# Altium footprint library LongMen.PcbLib: 245 footprints (part 6 of 16)
Each footprint in its own frame and in the unit in brackets; x right, y up, seen from the top. Pads: shape width x height; smd on the part's side, far side on the other; paste and mask are expansions set on the pad; w line width, h text height; cw(c..) or ccw(c..) is an arc to the next point about the centre after c.
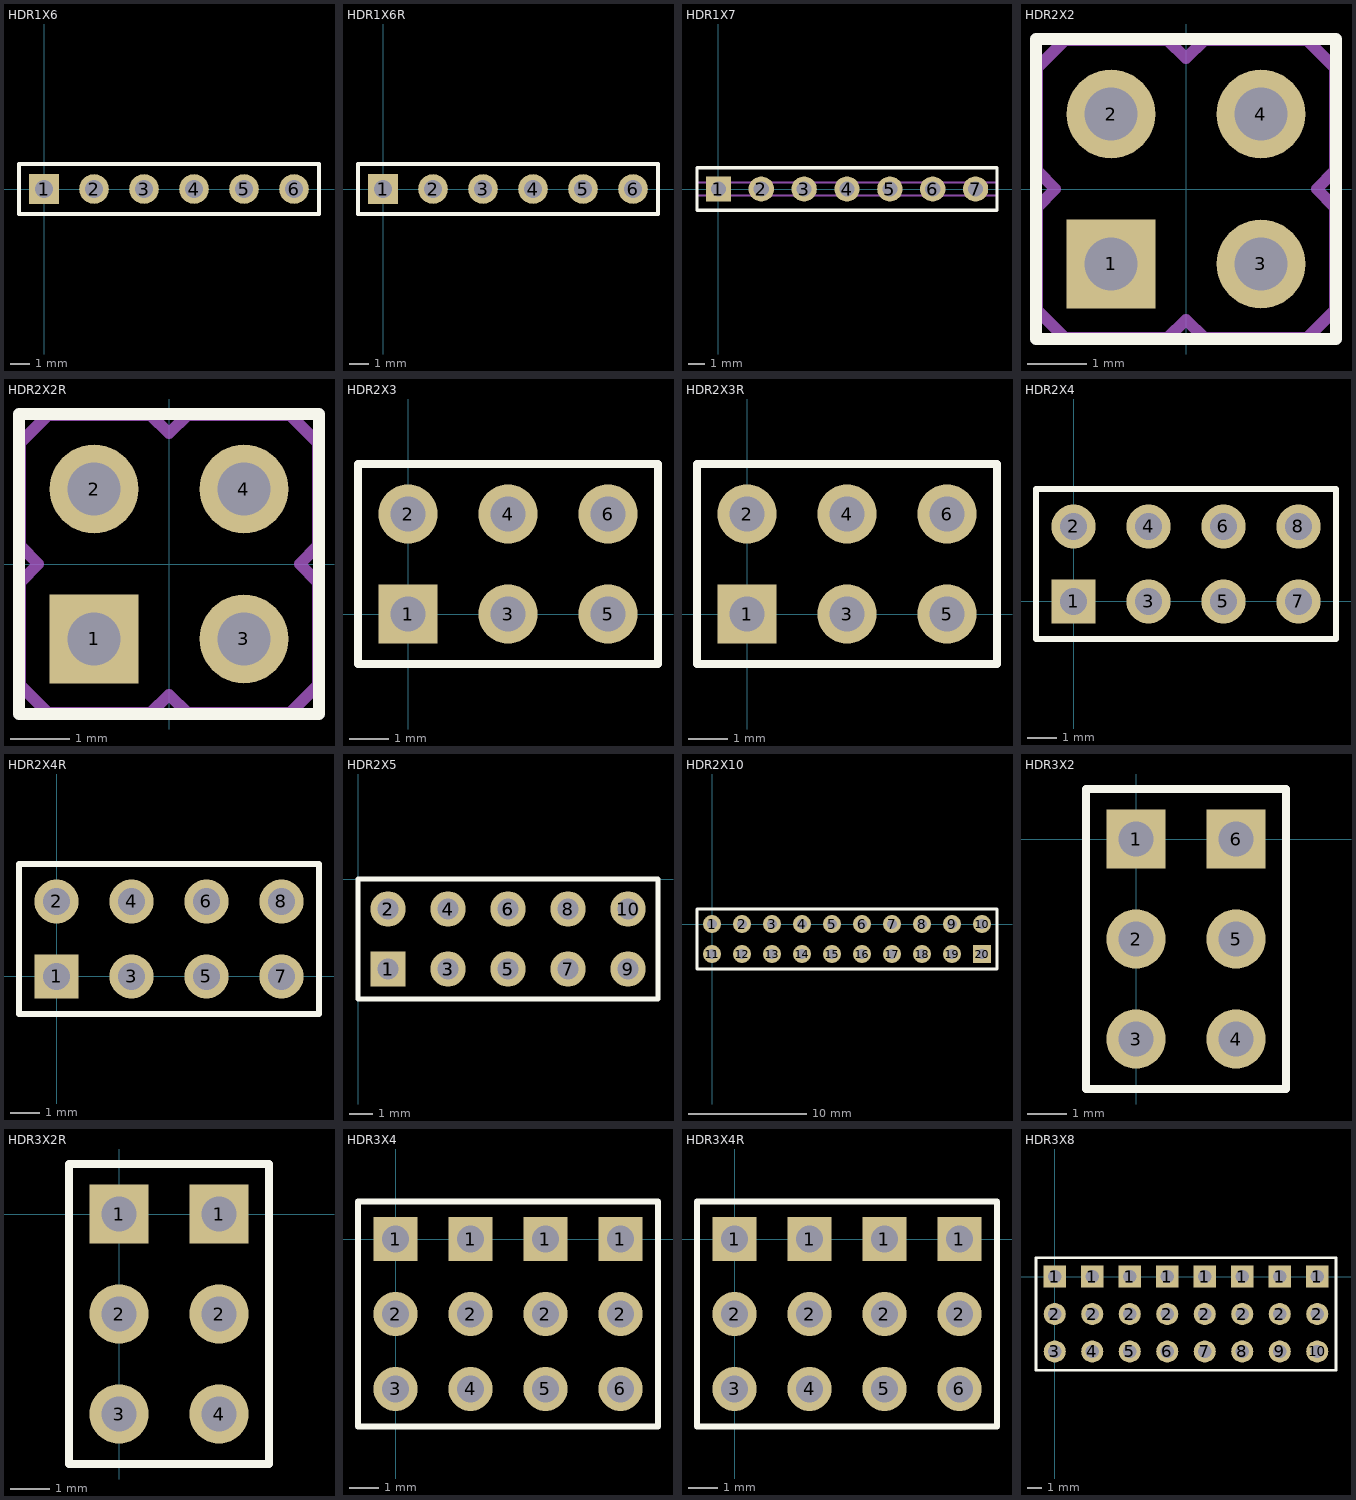
[diagram p5: the footprints below, top view; thin cyan lines are the x and y axes]

## HDR1X6 [mm] "Connector; Header; 6 Position"
pads (6):
  rect 1.5x1.5 hole 0.9: 1(0,0)
  round 1.5 hole 0.9: 2(2.54,0) 3(5.08,0) 4(7.62,0) 5(10.16,0) 6(12.7,0)
Top Overlay:
  lines w0.2: -1.27,-1.27 -1.27,1.27 13.97,1.27 13.97,-1.27 -1.27,-1.27
Mechanical 16:
  lines w0.1: -0.3,-0.3 0.3,-0.3 0.3,0.3 -0.3,0.3 -0.3,-0.3 ; 2.24,-0.3 2.84,-0.3 2.84,0.3 2.24,0.3 2.24,-0.3 ; 4.78,-0.3 5.38,-0.3 5.38,0.3 4.78,0.3 4.78,-0.3 ; 7.32,-0.3 7.92,-0.3 7.92,0.3 7.32,0.3 7.32,-0.3 ; 9.86,-0.3 10.46,-0.3 10.46,0.3 9.86,0.3 9.86,-0.3 ; 12.4,-0.3 13,-0.3 13,0.3 12.4,0.3 12.4,-0.3
3D body: height 8.54, standoff -3, extent -1.27,-1.245 13.97,1.245

## HDR1X6R [mm] "Connector; Header; 6 Position"
pads (6):
  rect 1.5x1.5 hole 0.9: 1(0,0)
  round 1.5 hole 0.9: 2(2.54,0) 3(5.08,0) 4(7.62,0) 5(10.16,0) 6(12.7,0)
Top Overlay:
  lines w0.2: -1.27,-1.27 13.97,-1.27 13.97,1.27 -1.27,1.27 -1.27,-1.27
Mechanical 16:
  lines w0.1: -0.3,-0.3 -0.3,0.3 0.3,0.3 0.3,-0.3 -0.3,-0.3 ; 2.24,-0.3 2.24,0.3 2.84,0.3 2.84,-0.3 2.24,-0.3 ; 4.78,-0.3 4.78,0.3 5.38,0.3 5.38,-0.3 4.78,-0.3 ; 7.32,-0.3 7.32,0.3 7.92,0.3 7.92,-0.3 7.32,-0.3 ; 9.86,-0.3 9.86,0.3 10.46,0.3 10.46,-0.3 9.86,-0.3 ; 12.4,-0.3 12.4,0.3 13,0.3 13,-0.3 12.4,-0.3
3D body: height 2.51, standoff -3, extent -1.27,-0.32 13.97,9.81

## HDR1X7 [mm] "Connector; Header; 7 Position"
pads (7):
  rect 1.5x1.5 hole 0.9: 1(0,0)
  round 1.5 hole 0.9: 2(2.54,0) 3(5.08,0) 4(7.62,0) 5(10.16,0) 6(12.7,0) 7(15.24,0)
Top Overlay:
  lines w0.2: -1.27,-1.27 16.51,-1.27 16.51,1.27 -1.27,1.27 -1.27,-1.27
Mechanical 15:
  lines w0.1: -1.27,-0.381 -1.27,-1.27 16.51,-1.27 16.51,-0.381 ; -1.27,-0.381 16.51,-0.381 ; -1.27,-0.381 -0.381,-0.381 -0.381,0.381 -1.27,0.381 ; -1.27,-0.381 -1.27,0.381 ; -1.27,0.381 16.51,0.381 ; -1.27,0.381 -1.27,1.27 16.51,1.27 16.51,0.381 ; 16.51,-0.381 15.621,-0.381 15.621,0.381 16.51,0.381 ; 16.51,-0.381 16.51,0.381 ; 0.381,-0.381 0.381,0.381 2.159,0.381 2.159,-0.381 0.381,-0.381 ; 2.921,-0.381 2.921,0.381 4.699,0.381 4.699,-0.381 2.921,-0.381 ; 5.461,-0.381 5.461,0.381 7.239,0.381 7.239,-0.381 5.461,-0.381 ; 8.001,-0.381 8.001,0.381 9.779,0.381 9.779,-0.381 8.001,-0.381 ; 10.541,-0.381 10.541,0.381 12.319,0.381 12.319,-0.381 10.541,-0.381 ; 13.081,-0.381 13.081,0.381 14.859,0.381 14.859,-0.381 13.081,-0.381
Mechanical 16:
  lines w0.1: -1.27,-1.27 16.51,-1.27 16.51,1.27 -1.27,1.27 -1.27,-1.27 ; -0.3,-0.3 -0.3,0.3 0.3,0.3 0.3,-0.3 -0.3,-0.3 ; 2.24,-0.3 2.24,0.3 2.84,0.3 2.84,-0.3 2.24,-0.3 ; 4.78,-0.3 4.78,0.3 5.38,0.3 5.38,-0.3 4.78,-0.3 ; 7.32,-0.3 7.32,0.3 7.92,0.3 7.92,-0.3 7.32,-0.3 ; 9.86,-0.3 9.86,0.3 10.46,0.3 10.46,-0.3 9.86,-0.3 ; 12.4,-0.3 12.4,0.3 13,0.3 13,-0.3 12.4,-0.3 ; 14.94,-0.3 14.94,0.3 15.54,0.3 15.54,-0.3 14.94,-0.3
3D body: height 0, standoff -2, extent 14.941,-0.299 15.539,0.299
3D body: height 0, standoff -2, extent 12.401,-0.299 12.999,0.299
3D body: height 0, standoff -2, extent 9.861,-0.299 10.459,0.299
3D body: height 0, standoff -2, extent 7.321,-0.299 7.919,0.299
3D body: height 0, standoff -2, extent 4.781,-0.299 5.379,0.299
3D body: height 0, standoff -2, extent 2.241,-0.299 2.839,0.299
3D body: height 0, standoff -2, extent -0.299,-0.299 0.299,0.299
3D body: height 8, standoff 0, extent -1.269,-1.269 16.509,-0.382
3D body: height 8, standoff 0, extent -1.269,0.382 16.509,1.269
3D body: height 8, standoff 0, extent 5.462,-0.38 7.238,0.38
3D body: height 8, standoff 0, extent 8.002,-0.38 9.778,0.38
3D body: height 8, standoff 0, extent 10.542,-0.38 12.318,0.38
3D body: height 8, standoff 0, extent 13.082,-0.38 14.858,0.38
3D body: height 8, standoff 0, extent 2.922,-0.38 4.698,0.38
3D body: height 8, standoff 0, extent 0.382,-0.38 2.158,0.38
3D body: height 8, standoff 0, extent -1.269,-0.38 -0.382,0.38
3D body: height 8, standoff 0, extent 15.622,-0.38 16.509,0.38

## HDR2X2 [mm]
pads (4):
  rect 1.5x1.5 hole 0.9: 1(-1.27,-1.27)
  round 1.5 hole 0.9: 2(-1.27,1.27) 3(1.27,-1.27) 4(1.27,1.27)
Top Overlay:
  lines w0.2: -2.54,-2.54 -2.54,2.54 2.54,2.54 2.54,-2.54 -2.54,-2.54
Mechanical 15:
  lines w0.2: -2.52,-2.052 -2.52,-0.615 -2.52,-0.308 -2.213,0 -2.52,0.308 -2.52,0.615 -2.52,2.052 -2.052,2.52 -0.615,2.52 -0.308,2.52 0,2.213 0.308,2.52 0.615,2.52 2.052,2.52 2.52,2.052 2.52,0.615 2.52,0.308 2.213,0 2.52,-0.308 2.52,-0.615 2.52,-2.052 2.052,-2.52 0.615,-2.52 0.308,-2.52 0,-2.213 -0.308,-2.52 -0.615,-2.52 -2.052,-2.52 -2.52,-2.052
Mechanical 16:
  lines w0.2: -1.57,-1.57 -0.97,-1.57 -0.97,-0.97 -1.57,-0.97 -1.57,-1.57 ; -1.57,0.97 -0.97,0.97 -0.97,1.57 -1.57,1.57 -1.57,0.97 ; 0.97,-1.57 1.57,-1.57 1.57,-0.97 0.97,-0.97 0.97,-1.57 ; 0.97,0.97 1.57,0.97 1.57,1.57 0.97,1.57 0.97,0.97
3D body: height 8.54, standoff -3, extent -2.54,-2.515 2.54,2.515

## HDR2X2R [mm]
pads (4):
  rect 1.5x1.5 hole 0.9: 1(-1.27,-1.27)
  round 1.5 hole 0.9: 2(-1.27,1.27) 3(1.27,-1.27) 4(1.27,1.27)
Top Overlay:
  lines w0.2: -2.54,-2.54 -2.54,2.54 2.54,2.54 2.54,-2.54 -2.54,-2.54
Mechanical 15:
  lines w0.2: -2.52,-2.052 -2.52,-0.615 -2.52,-0.308 -2.213,0 -2.52,0.308 -2.52,0.615 -2.52,2.052 -2.052,2.52 -0.615,2.52 -0.308,2.52 0,2.213 0.308,2.52 0.615,2.52 2.052,2.52 2.52,2.052 2.52,0.615 2.52,0.308 2.213,0 2.52,-0.308 2.52,-0.615 2.52,-2.052 2.052,-2.52 0.615,-2.52 0.308,-2.52 0,-2.213 -0.308,-2.52 -0.615,-2.52 -2.052,-2.52 -2.52,-2.052
Mechanical 16:
  lines w0.2: -1.57,-1.57 -0.97,-1.57 -0.97,-0.97 -1.57,-0.97 -1.57,-1.57 ; -1.57,0.97 -0.97,0.97 -0.97,1.57 -1.57,1.57 -1.57,0.97 ; 0.97,-1.57 1.57,-1.57 1.57,-0.97 0.97,-0.97 0.97,-1.57 ; 0.97,0.97 1.57,0.97 1.57,1.57 0.97,1.57 0.97,0.97
3D body: height 5.05, standoff -3, extent -2.54,-1.59 2.54,11.08

## HDR2X3 [mm] "Connector; Header; 3x2 Position"
pads (6):
  rect 1.5x1.5 hole 0.9: 1(0,0)
  round 1.5 hole 0.9: 2(0,2.54) 3(2.54,0) 4(2.54,2.54) 5(5.08,0) 6(5.08,2.54)
Top Overlay:
  lines w0.2: 1.482,-1.27 6.35,-1.27 ; 6.35,-1.27 -1.27,-1.27 -1.27,3.81 6.35,3.81 6.35,-1.27
Mechanical 16:
  lines w0.1: -0.3,-0.3 -0.3,0.3 0.3,0.3 0.3,-0.3 -0.3,-0.3 ; -0.3,2.24 -0.3,2.84 0.3,2.84 0.3,2.24 -0.3,2.24 ; 2.24,-0.3 2.24,0.3 2.84,0.3 2.84,-0.3 2.24,-0.3 ; 2.24,2.24 2.24,2.84 2.84,2.84 2.84,2.24 2.24,2.24 ; 4.78,-0.3 4.78,0.3 5.38,0.3 5.38,-0.3 4.78,-0.3 ; 4.78,2.24 4.78,2.84 5.38,2.84 5.38,2.24 4.78,2.24
3D body: height 8.54, standoff -3, extent -1.27,-1.245 6.35,3.785

## HDR2X3R [mm] "Connector; Header; 3x2 Position"
pads (6):
  rect 1.5x1.5 hole 0.9: 1(0,0)
  round 1.5 hole 0.9: 2(0,2.54) 3(2.54,0) 4(2.54,2.54) 5(5.08,0) 6(5.08,2.54)
Top Overlay:
  lines w0.2: 1.482,-1.27 6.35,-1.27 ; 6.35,-1.27 -1.27,-1.27 -1.27,3.81 6.35,3.81 6.35,-1.27
Mechanical 16:
  lines w0.1: -0.3,-0.3 -0.3,0.3 0.3,0.3 0.3,-0.3 -0.3,-0.3 ; -0.3,2.24 -0.3,2.84 0.3,2.84 0.3,2.24 -0.3,2.24 ; 2.24,-0.3 2.24,0.3 2.84,0.3 2.84,-0.3 2.24,-0.3 ; 2.24,2.24 2.24,2.84 2.84,2.84 2.84,2.24 2.24,2.24 ; 4.78,-0.3 4.78,0.3 5.38,0.3 5.38,-0.3 4.78,-0.3 ; 4.78,2.24 4.78,2.84 5.38,2.84 5.38,2.24 4.78,2.24
3D body: height 5.05, standoff -3, extent -1.27,-0.32 6.35,12.35

## HDR2X4 [mm] "Connector; Header; 3x2 Position"
pads (8):
  rect 1.5x1.5 hole 0.9: 1(0,0)
  round 1.5 hole 0.9: 2(0,2.54) 3(2.54,0) 4(2.54,2.54) 5(5.08,0) 6(5.08,2.54) 7(7.62,0) 8(7.62,2.54)
Top Overlay:
  lines w0.2: 1.482,-1.27 8.89,-1.27 8.89,3.81 -1.27,3.81 -1.27,-1.27 6.35,-1.27
Mechanical 16:
  lines w0.1: -0.3,-0.3 -0.3,0.3 0.3,0.3 0.3,-0.3 -0.3,-0.3 ; -0.3,2.24 -0.3,2.84 0.3,2.84 0.3,2.24 -0.3,2.24 ; 2.24,-0.3 2.24,0.3 2.84,0.3 2.84,-0.3 2.24,-0.3 ; 2.24,2.24 2.24,2.84 2.84,2.84 2.84,2.24 2.24,2.24 ; 4.78,-0.3 4.78,0.3 5.38,0.3 5.38,-0.3 4.78,-0.3 ; 4.78,2.24 4.78,2.84 5.38,2.84 5.38,2.24 4.78,2.24
3D body: height 8.54, standoff -3, extent -1.27,-1.245 8.89,3.785

## HDR2X4R [mm] "Connector; Header; 3x2 Position"
pads (8):
  rect 1.5x1.5 hole 0.9: 1(0,0)
  round 1.5 hole 0.9: 2(0,2.54) 3(2.54,0) 4(2.54,2.54) 5(5.08,0) 6(5.08,2.54) 7(7.62,0) 8(7.62,2.54)
Top Overlay:
  lines w0.2: 1.482,-1.27 8.89,-1.27 8.89,3.81 -1.27,3.81 -1.27,-1.27 6.35,-1.27
Mechanical 16:
  lines w0.1: -0.3,-0.3 -0.3,0.3 0.3,0.3 0.3,-0.3 -0.3,-0.3 ; -0.3,2.24 -0.3,2.84 0.3,2.84 0.3,2.24 -0.3,2.24 ; 2.24,-0.3 2.24,0.3 2.84,0.3 2.84,-0.3 2.24,-0.3 ; 2.24,2.24 2.24,2.84 2.84,2.84 2.84,2.24 2.24,2.24 ; 4.78,-0.3 4.78,0.3 5.38,0.3 5.38,-0.3 4.78,-0.3 ; 4.78,2.24 4.78,2.84 5.38,2.84 5.38,2.24 4.78,2.24
3D body: height 5.05, standoff -3, extent -1.27,-0.32 8.89,12.35

## HDR2X5 [mm]
pads (16):
  rect 1.5x1.5 hole 0.9: 1(1.27,-3.81) 1(1.27,-3.81)
  round 1.5 hole 0.9: 2(1.27,-1.27) 2(1.27,-1.27) 3(3.81,-3.81) 3(3.81,-3.81) 4(3.81,-1.27) 4(3.81,-1.27) 5(6.35,-3.81) 5(6.35,-3.81) 6(6.35,-1.27) 6(6.35,-1.27) 7(8.89,-3.81) 8(8.89,-1.27) 9(11.43,-3.81) 10(11.43,-1.27)
Top Overlay:
  lines w0.2: 0,-5.08 0,0 ; 0,-5.08 12.7,-5.08 ; 0,-5.08 0,0 ; 0,-5.08 12.7,-5.08 ; 0,0 12.7,0 ; 0,0 12.7,0 ; 12.7,-5.08 12.7,0 ; 12.7,-5.08 2.752,-5.08 12.7,-5.08
Mechanical 16:
  lines w0.1: 0.97,-4.11 1.57,-4.11 ; 0.97,-4.11 0.97,-3.51 ; 0.97,-4.11 1.57,-4.11 ; 0.97,-4.11 0.97,-3.51 ; 0.97,-3.51 1.57,-3.51 ; 0.97,-3.51 1.57,-3.51 ; 0.97,-1.57 1.57,-1.57 ; 0.97,-1.57 0.97,-0.97 ; 0.97,-1.57 1.57,-1.57 ; 0.97,-1.57 0.97,-0.97 ; 0.97,-0.97 1.57,-0.97 ; 0.97,-0.97 1.57,-0.97 ; 1.57,-4.11 1.57,-3.51 ; 1.57,-4.11 1.57,-3.51 ; 1.57,-1.57 1.57,-0.97 ; 1.57,-1.57 1.57,-0.97 ; 3.51,-4.11 4.11,-4.11 ; 3.51,-4.11 3.51,-3.51 ; 3.51,-4.11 4.11,-4.11 ; 3.51,-4.11 3.51,-3.51 ; 3.51,-3.51 4.11,-3.51 ; 3.51,-3.51 4.11,-3.51 ; 3.51,-1.57 4.11,-1.57 ; 3.51,-1.57 3.51,-0.97 ; 3.51,-1.57 4.11,-1.57 ; 3.51,-1.57 3.51,-0.97 ; 3.51,-0.97 4.11,-0.97 ; 3.51,-0.97 4.11,-0.97 ; 4.11,-4.11 4.11,-3.51 ; 4.11,-4.11 4.11,-3.51 ; 4.11,-1.57 4.11,-0.97 ; 4.11,-1.57 4.11,-0.97 ; 6.05,-4.11 6.65,-4.11 ; 6.05,-4.11 6.05,-3.51 ; 6.05,-4.11 6.65,-4.11 ; 6.05,-4.11 6.05,-3.51 ; 6.05,-3.51 6.65,-3.51 ; 6.05,-3.51 6.65,-3.51 ; 6.05,-1.57 6.65,-1.57 ; 6.05,-1.57 6.05,-0.97 ; 6.05,-1.57 6.65,-1.57 ; 6.05,-1.57 6.05,-0.97 ; 6.05,-0.97 6.65,-0.97 ; 6.05,-0.97 6.65,-0.97 ; 6.65,-4.11 6.65,-3.51 ; 6.65,-4.11 6.65,-3.51 ; 6.65,-1.57 6.65,-0.97 ; 6.65,-1.57 6.65,-0.97
3D body: height 8.54, standoff -3, extent 7.62,-5.055 12.7,-0.025
3D body: height 8.54, standoff -3, extent 0,-5.055 7.62,-0.025

## HDR2X10 [mil]
pads (20):
  round 60 hole 32: 1(0,0) 2(100,0) 3(200,0) 4(300,0) 5(400,0) 6(500,0) 7(600,0) 8(700,0) 9(800,0) 10(900,0) 11(0,-100) 12(100,-100) 13(200,-100) 14(300,-100) 15(400,-100) 16(500,-100) 17(600,-100) 18(700,-100) 19(800,-100)
  rect 60x60 hole 32: 20(900,-100)
Top Overlay:
  lines w10: -50,-150 -50,50 950,50 950,-150 -50,-150

## HDR3X2 [mm]
pads (6):
  rect 1.5x1.5 hole 0.9: 1(0,0) 6(2.54,0)
  round 1.5 hole 0.9: 2(0,-2.54) 3(0,-5.08) 4(2.54,-5.08) 5(2.54,-2.54)
Top Overlay:
  lines w0.2: -1.27,-6.35 3.81,-6.35 3.81,1.27 -1.27,1.27 -1.27,-6.35
Mechanical 16:
  lines w0.1: -0.3,-5.38 -0.3,-4.78 0.3,-4.78 0.3,-5.38 -0.3,-5.38 ; -0.3,-2.84 -0.3,-2.24 0.3,-2.24 0.3,-2.84 -0.3,-2.84 ; -0.3,-0.3 0.3,-0.3 0.3,0.3 -0.3,0.3 -0.3,-0.3 ; 2.24,-5.38 2.24,-4.78 2.84,-4.78 2.84,-5.38 2.24,-5.38 ; 2.24,-2.84 2.24,-2.24 2.84,-2.24 2.84,-2.84 2.24,-2.84 ; 2.24,-0.3 2.24,0.3 2.84,0.3 2.84,-0.3 2.24,-0.3
3D body: height 8.54, standoff -3, extent -1.27,-6.325 3.81,1.245

## HDR3X2R [mm]
pads (6):
  rect 1.5x1.5 hole 0.9: 1(0,0) 1(2.54,0)
  round 1.5 hole 0.9: 2(0,-2.54) 2(2.54,-2.54) 3(0,-5.08) 4(2.54,-5.08)
Top Overlay:
  lines w0.2: -1.27,-6.35 -1.27,1.27 3.81,1.27 3.81,-6.35 -1.27,-6.35
Mechanical 16:
  lines w0.1: -0.3,-5.38 0.3,-5.38 0.3,-4.78 -0.3,-4.78 -0.3,-5.38 ; -0.3,-2.84 0.3,-2.84 0.3,-2.24 -0.3,-2.24 -0.3,-2.84 ; -0.3,-0.3 -0.3,0.3 0.3,0.3 0.3,-0.3 -0.3,-0.3 ; 2.24,-5.38 2.84,-5.38 2.84,-4.78 2.24,-4.78 2.24,-5.38 ; 2.24,-2.84 2.84,-2.84 2.84,-2.24 2.24,-2.24 2.24,-2.84 ; 2.24,-0.3 2.84,-0.3 2.84,0.3 2.24,0.3 2.24,-0.3
3D body: height 7.59, standoff -3, extent -1.27,-5.4 3.81,9.81

## HDR3X4 [mm]
pads (12):
  rect 1.5x1.5 hole 0.9: 1(0,0) 1(2.54,0) 1(5.08,0) 1(7.62,0)
  round 1.5 hole 0.9: 2(0,-2.54) 2(2.54,-2.54) 2(5.08,-2.54) 2(7.62,-2.54) 3(0,-5.08) 4(2.54,-5.08) 5(5.08,-5.08) 6(7.62,-5.08)
Top Overlay:
  lines w0.2: -1.27,-6.35 8.89,-6.35 8.89,1.27 -1.27,1.27 -1.27,-6.35
Mechanical 16:
  lines w0.1: -0.3,-5.38 -0.3,-4.78 0.3,-4.78 0.3,-5.38 -0.3,-5.38 ; -0.3,-2.84 -0.3,-2.24 0.3,-2.24 0.3,-2.84 -0.3,-2.84 ; -0.3,-0.3 0.3,-0.3 0.3,0.3 -0.3,0.3 -0.3,-0.3 ; 2.24,-5.38 2.24,-4.78 2.84,-4.78 2.84,-5.38 2.24,-5.38 ; 2.24,-2.84 2.24,-2.24 2.84,-2.24 2.84,-2.84 2.24,-2.84 ; 2.24,-0.3 2.24,0.3 2.84,0.3 2.84,-0.3 2.24,-0.3 ; 4.78,-5.38 5.38,-5.38 5.38,-4.78 4.78,-4.78 4.78,-5.38 ; 4.78,-2.84 5.38,-2.84 5.38,-2.24 4.78,-2.24 4.78,-2.84 ; 4.78,-0.3 4.78,0.3 5.38,0.3 5.38,-0.3 4.78,-0.3 ; 7.32,-5.38 7.92,-5.38 7.92,-4.78 7.32,-4.78 7.32,-5.38 ; 7.32,-2.84 7.92,-2.84 7.92,-2.24 7.32,-2.24 7.32,-2.84 ; 7.32,-0.3 7.32,0.3 7.92,0.3 7.92,-0.3 7.32,-0.3
3D body: height 8.54, standoff -3, extent -1.27,-6.325 8.89,1.245

## HDR3X4R [mm]
pads (12):
  rect 1.5x1.5 hole 0.9: 1(0,0) 1(2.54,0) 1(5.08,0) 1(7.62,0)
  round 1.5 hole 0.9: 2(0,-2.54) 2(2.54,-2.54) 2(5.08,-2.54) 2(7.62,-2.54) 3(0,-5.08) 4(2.54,-5.08) 5(5.08,-5.08) 6(7.62,-5.08)
Top Overlay:
  lines w0.2: -1.27,-6.35 -1.27,1.27 8.89,1.27 8.89,-6.35 -1.27,-6.35
Mechanical 16:
  lines w0.1: -0.3,-5.38 0.3,-5.38 0.3,-4.78 -0.3,-4.78 -0.3,-5.38 ; -0.3,-2.84 0.3,-2.84 0.3,-2.24 -0.3,-2.24 -0.3,-2.84 ; -0.3,-0.3 -0.3,0.3 0.3,0.3 0.3,-0.3 -0.3,-0.3 ; 2.24,-5.38 2.84,-5.38 2.84,-4.78 2.24,-4.78 2.24,-5.38 ; 2.24,-2.84 2.84,-2.84 2.84,-2.24 2.24,-2.24 2.24,-2.84 ; 2.24,-0.3 2.84,-0.3 2.84,0.3 2.24,0.3 2.24,-0.3 ; 4.78,-5.38 4.78,-4.78 5.38,-4.78 5.38,-5.38 4.78,-5.38 ; 4.78,-2.84 4.78,-2.24 5.38,-2.24 5.38,-2.84 4.78,-2.84 ; 4.78,-0.3 5.38,-0.3 5.38,0.3 4.78,0.3 4.78,-0.3 ; 7.32,-5.38 7.32,-4.78 7.92,-4.78 7.92,-5.38 7.32,-5.38 ; 7.32,-2.84 7.32,-2.24 7.92,-2.24 7.92,-2.84 7.32,-2.84 ; 7.32,-0.3 7.92,-0.3 7.92,0.3 7.32,0.3 7.32,-0.3
3D body: height 7.59, standoff -3, extent -1.27,-5.4 8.89,9.81

## HDR3X8 [mm]
pads (24):
  rect 1.5x1.5 hole 0.9: 1(0,0) 1(2.54,0) 1(5.08,0) 1(7.62,0) 1(10.16,0) 1(12.7,0) 1(15.24,0) 1(17.78,0)
  round 1.5 hole 0.9: 2(0,-2.54) 2(2.54,-2.54) 2(5.08,-2.54) 2(7.62,-2.54) 2(10.16,-2.54) 2(12.7,-2.54) 2(15.24,-2.54) 2(17.78,-2.54) 3(0,-5.08) 4(2.54,-5.08) 5(5.08,-5.08) 6(7.62,-5.08) 7(10.16,-5.08) 8(12.7,-5.08) 9(15.24,-5.08) 10(17.78,-5.08)
Top Overlay:
  lines w0.2: -1.27,-6.35 -1.27,1.27 19.05,1.27 19.05,-6.35 -1.27,-6.35
Mechanical 16:
  lines w0.1: -0.3,-5.38 0.3,-5.38 0.3,-4.78 -0.3,-4.78 -0.3,-5.38 ; -0.3,-2.84 0.3,-2.84 0.3,-2.24 -0.3,-2.24 -0.3,-2.84 ; -0.3,-0.3 -0.3,0.3 0.3,0.3 0.3,-0.3 -0.3,-0.3 ; 2.24,-5.38 2.84,-5.38 2.84,-4.78 2.24,-4.78 2.24,-5.38 ; 2.24,-2.84 2.84,-2.84 2.84,-2.24 2.24,-2.24 2.24,-2.84 ; 2.24,-0.3 2.84,-0.3 2.84,0.3 2.24,0.3 2.24,-0.3 ; 4.78,-5.38 4.78,-4.78 5.38,-4.78 5.38,-5.38 4.78,-5.38 ; 4.78,-2.84 4.78,-2.24 5.38,-2.24 5.38,-2.84 4.78,-2.84 ; 4.78,-0.3 5.38,-0.3 5.38,0.3 4.78,0.3 4.78,-0.3 ; 7.32,-5.38 7.32,-4.78 7.92,-4.78 7.92,-5.38 7.32,-5.38 ; 7.32,-2.84 7.32,-2.24 7.92,-2.24 7.92,-2.84 7.32,-2.84 ; 7.32,-0.3 7.92,-0.3 7.92,0.3 7.32,0.3 7.32,-0.3 ; 9.86,-5.38 9.86,-4.78 10.46,-4.78 10.46,-5.38 9.86,-5.38 ; 9.86,-2.84 9.86,-2.24 10.46,-2.24 10.46,-2.84 9.86,-2.84 ; 9.86,-0.3 10.46,-0.3 10.46,0.3 9.86,0.3 9.86,-0.3 ; 12.4,-5.38 12.4,-4.78 13,-4.78 13,-5.38 12.4,-5.38 ; 12.4,-2.84 12.4,-2.24 13,-2.24 13,-2.84 12.4,-2.84 ; 12.4,-0.3 12.4,0.3 13,0.3 13,-0.3 12.4,-0.3 ; 14.94,-5.38 15.54,-5.38 15.54,-4.78 14.94,-4.78 14.94,-5.38 ; 14.94,-2.84 15.54,-2.84 15.54,-2.24 14.94,-2.24 14.94,-2.84 ; 14.94,-0.3 14.94,0.3 15.54,0.3 15.54,-0.3 14.94,-0.3 ; 17.48,-5.38 18.08,-5.38 18.08,-4.78 17.48,-4.78 17.48,-5.38 ; 17.48,-2.84 18.08,-2.84 18.08,-2.24 17.48,-2.24 17.48,-2.84 ; 17.48,-0.3 17.48,0.3 18.08,0.3 18.08,-0.3 17.48,-0.3
3D body: height 8.54, standoff -3, extent -1.27,-6.325 19.05,1.245